# Altium footprint library LUMI_Handy_Soldering_LIB.PcbLib: 562 footprints (part 24 of 36)
Each footprint in its own frame and in the unit in brackets; x right, y up, seen from the top. Pads: shape width x height; smd on the part's side, far side on the other; paste and mask are expansions set on the pad; w line width, h text height; cw(c..) or ccw(c..) is an arc to the next point about the centre after c.
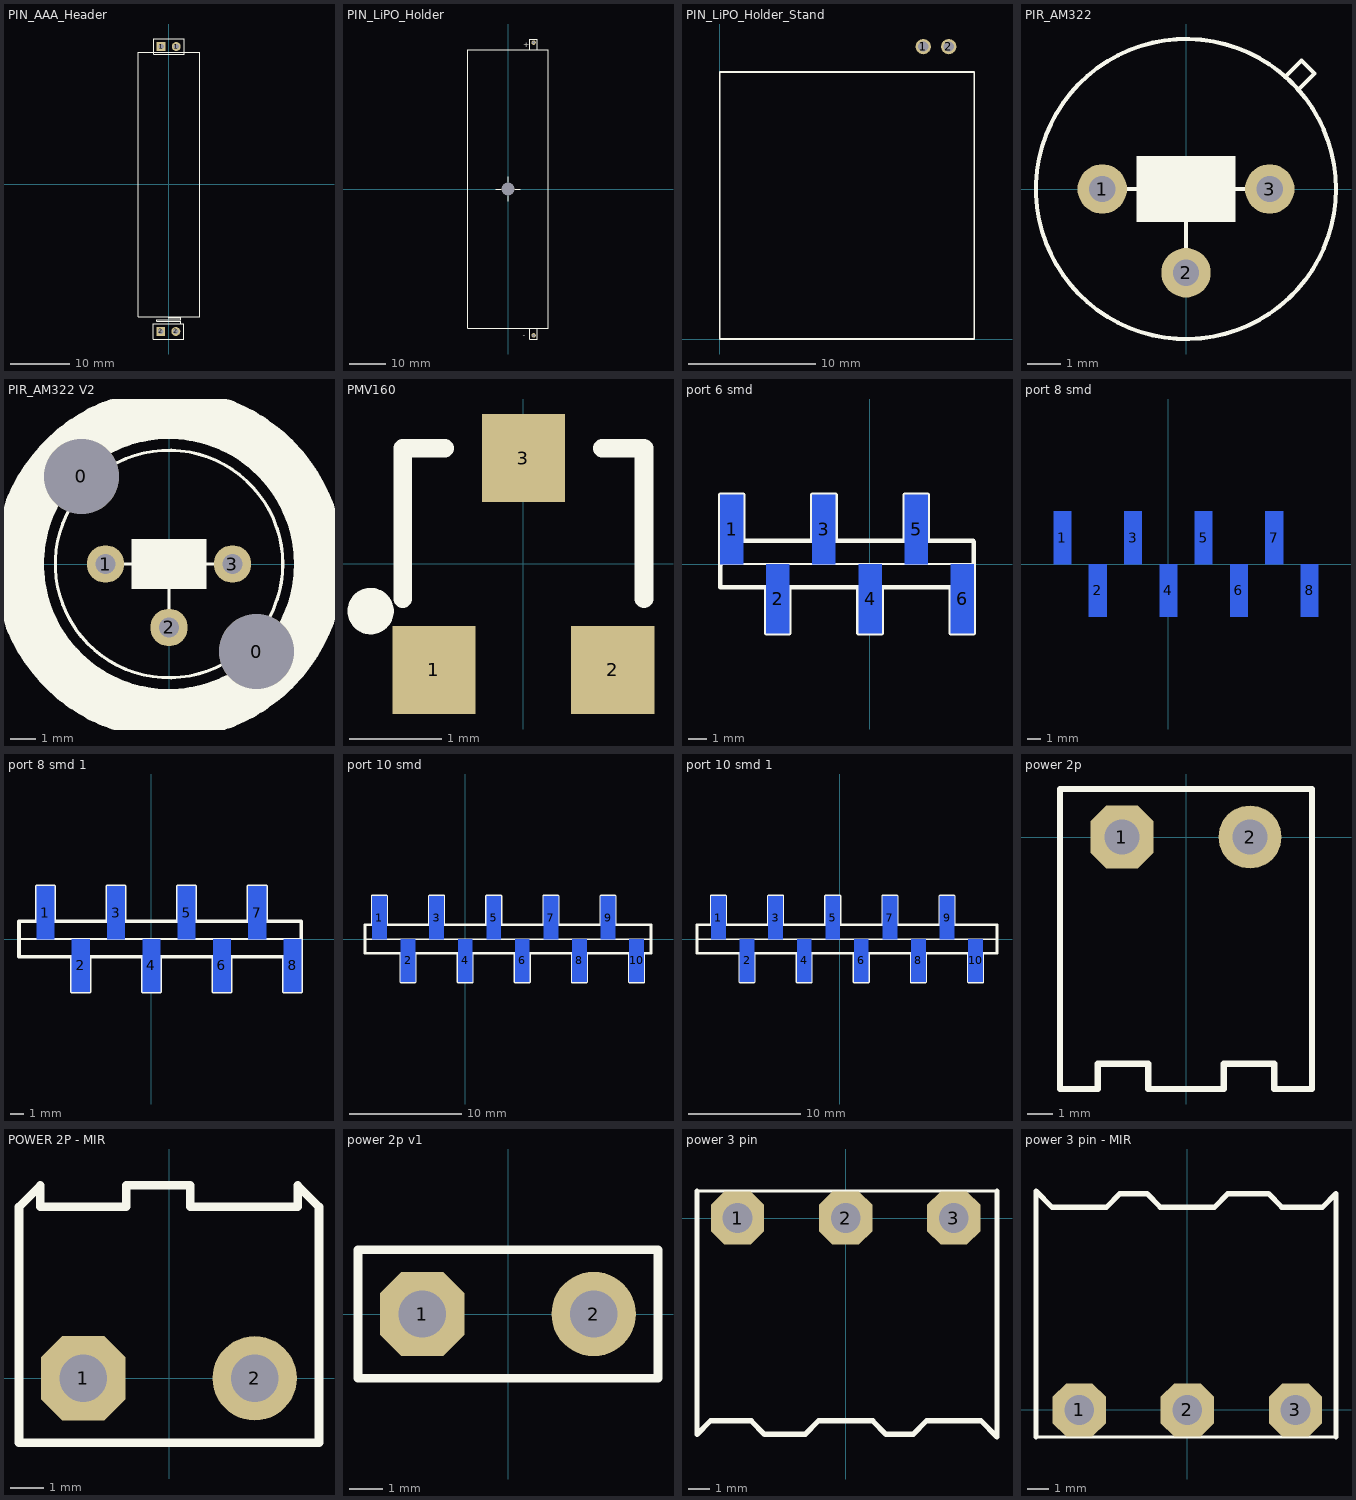
[diagram p23: the footprints below, top view; thin cyan lines are the x and y axes]

## PIN_AAA_Header [mm]
pads (4):
  rect 1.5x1.5 hole 0.9: 1(-1.275,23.15) 2(-1.34,-24.7)
  round 1.5 hole 0.9: 1(1.265,23.15) 2(1.2,-24.7)
Top Overlay:
  lines w0.127: -2,-23.43 2,-23.43 2,-23 -2,-23 -2,-22.7 2,-22.7 2,-22.4 -0.1,-22.4 ; 5.2,-22.2 -5.1,-22.2 -5.1,22.2 5.2,22.2 5.2,-22.2 ; 5.2,-22.2 5.2,-22.2
  lines w0.2: -2.61,-25.97 2.56,-25.97 2.56,-23.43 -2.61,-23.43 -2.61,-25.97 ; -2.545,21.88 -2.545,24.42 2.625,24.42 2.625,21.88 -2.545,21.88
3D body: height 9.13, standoff -1.13, extent -5.05,-22.175 5.2,22.175
3D body: height 8.55, standoff -2.43, extent -2.559,-25.945 2.521,-23.405
3D body: height 8.55, standoff -2.43, extent -2.494,21.905 2.586,24.445

## PIN_LiPO_Holder [mm]
pads (3):
  round 0 hole 3.5: 0(0,0)
  round 1.2 hole 0.8: 1(7,40) 2(7,-40)
Top Overlay:
  lines w0.127: -3.3,0 -1.8,0 ; 0,-3.3 0,-1.8 ; 0,1.8 0,3.3 ; 1.8,0 3.3,0 ; 6,-38 6,-41 8,-41 8,-38 ; 6,38 6,41 8,41 8,38 ; -11,-38 -11,38 11,38 11,-38 -11,-38
  text "-" at 4,-40.8 h1.52
  text "+" at 4.1,38.8 h1.52
3D body: height 21, standoff 1, extent -11,-38 11,38

## PIN_LiPO_Holder_Stand [mm]
pads (2):
  round 1.2 hole 0.8: 1(16,23) 2(18,23)
Top Overlay:
  lines w0.127: 0,0 0,21 20,21 20,0 0,0

## PIR_AM322 [mm]
pads (3):
  round 1.5 hole 0.8: 1(-2.54,0) 2(0,-2.54) 3(2.54,0)
Top Overlay:
  circle w0.127: c0,0 r4.55
  rectangle: -1.5,-1 1.5,1
  lines w0.127: -2.54,0 0,0 ; 0,-2.54 0,0 ; 2.54,0 0,0 ; 3,3.4 3.5,3.9 ; 3.4,3 3.4,3 ; 3.4,3 3.9,3.5 3.5,3.9 ; 3.5,3.9 3.5,3.9
3D body: height 4.7, standoff -2, extent -4.55,-4.55 4.52,4.55

## PIR_AM322 V2 [mm]
pads (5):
  round 3 hole 3: 0(-3.5,3.5) 0(3.5,-3.5)
  round 1.5 hole 0.8: 1(-2.54,0) 2(0,-2.54) 3(2.54,0)
Top Overlay:
  circle w2: c0,0 r6
  circle w0.127: c0,0 r4.55
  rectangle: -1.5,-1 1.5,1
  lines w0.127: -3.4,3 -3.9,3.5 ; -2.54,0 0,0 ; 0,-2.54 0,0 ; 2.54,0 0,0 ; -3.9,3.5 -3.9,3.5 ; -3.9,3.5 -3.5,3.9 -3,3.4 ; -3,3.4 -3,3.4
3D body: height 4.7, standoff -2, extent -4.55,-4.55 4.55,4.52

## PMV160 [mm] "P-MOSFET"
pads (3):
  rect 0.9x0.95 smd: 1(-0.965,-1.143) 2(0.965,-1.143) 3(0,1.143)
Top Overlay:
  circle w0.25: c-1.649,-0.508 r0.125
  lines w0.2: -1.3,-0.375 -1.3,1.25 -0.85,1.25 ; 0.85,1.25 1.3,1.25 1.3,-0.375
3D body: height 1, standoff 0, extent -1.46,-1.17 1.46,1.17

## port 6 smd [mm]
pads (6):
  rect 1.27x3.81 smd far side: 1(-7.605,1.925) 2(-5.065,-1.885) 3(-2.525,1.925) 4(0.015,-1.885) 5(2.555,1.925) 6(5.095,-1.885)
Top Overlay:
  lines w0.127: -8.128,0 5.73,0.02
  lines w0.254: -8.24,-1.25 -5.7,-1.25 -5.7,-3.79 -4.43,-3.79 -4.43,-1.25 -0.62,-1.25 -0.62,-3.79 0.65,-3.79 0.65,-1.25 4.46,-1.25 4.46,-3.79 5.73,-3.79 5.73,-1.25 5.73,1.255 5.695,1.29 3.19,1.29 3.19,3.83 1.92,3.83 1.92,1.29 -1.89,1.29 -1.89,3.83 -3.16,3.83 -3.16,1.29 -6.97,1.29 -6.97,3.83 -8.24,3.83 -8.24,1.29 -8.24,-1.25

## port 8 smd [mm]
pads (8):
  rect 1.27x3.81 smd far side: 1(-7.605,1.925) 2(-5.065,-1.885) 3(-2.525,1.925) 4(0.015,-1.885) 5(2.555,1.925) 6(5.095,-1.885) 7(7.635,1.925) 8(10.175,-1.885)

## port 8 smd 1 [mm]
pads (8):
  rect 1.27x3.81 smd far side: 1(-7.605,1.925) 2(-5.065,-1.885) 3(-2.525,1.925) 4(0.015,-1.885) 5(2.555,1.925) 6(5.095,-1.885) 7(7.635,1.925) 8(10.175,-1.885)
Top Overlay:
  lines w0.127: -9.51,0.02 10.79,0.02
  lines w0.254: 10.79,1.29 8.27,1.29 8.27,3.83 7,3.83 7,1.29 3.19,1.29 3.19,3.83 1.92,3.83 1.92,1.29 -1.89,1.29 -1.89,3.83 -3.16,3.83 -3.16,1.29 -6.97,1.29 -6.97,3.83 -8.24,3.83 -8.24,1.29 -9.51,1.29 -9.51,-1.25 -5.7,-1.25 -5.7,-3.79 -4.43,-3.79 -4.43,-1.25 -0.62,-1.25 -0.62,-3.79 0.65,-3.79 0.65,-1.25 4.46,-1.25 4.46,-3.79 5.73,-3.79 5.73,-1.25 9.54,-1.25 9.54,-3.79 10.81,-3.79 10.81,1.27

## port 10 smd [mm]
pads (10):
  rect 1.27x3.81 smd far side: 1(-7.62,1.905) 2(-5.08,-1.905) 3(-2.54,1.905) 4(0,-1.905) 5(2.54,1.905) 6(5.08,-1.905) 7(7.62,1.905) 8(10.16,-1.905) 9(12.7,1.905) 10(15.24,-1.905)
Top Overlay:
  lines w0.127: -8.89,0 16.51,0
  lines w0.254: -8.89,-1.27 -5.715,-1.27 -5.715,-3.81 -4.445,-3.81 -4.445,-1.27 -0.635,-1.27 -0.635,-3.81 0.635,-3.81 0.635,-1.27 4.445,-1.27 4.445,-3.81 5.715,-3.81 5.715,-1.27 9.525,-1.27 9.525,-3.81 10.795,-3.81 10.795,-1.27 13.97,-1.27 14.605,-1.27 14.605,-3.81 15.875,-3.81 15.875,-1.27 16.51,-1.27 16.51,1.27 13.97,1.27 13.335,1.27 13.335,3.81 12.065,3.81 12.065,1.27 8.255,1.27 8.255,3.81 6.985,3.81 6.985,1.27 3.175,1.27 3.175,3.81 1.905,3.81 1.905,1.27 -1.905,1.27 -1.905,3.81 -3.175,3.81 -3.175,1.27 -6.985,1.27 -6.985,3.81 -8.255,3.81 -8.255,1.27 -8.89,1.27 -8.89,-1.27
3D body: height -0.48, standoff -10.32, extent -8.89,-2.5 16.51,2.5

## port 10 smd 1 [mm]
pads (10):
  rect 1.27x3.81 smd far side: 1(-10.795,1.905) 2(-8.255,-1.905) 3(-5.715,1.905) 4(-3.175,-1.905) 5(-0.635,1.905) 6(1.905,-1.905) 7(4.445,1.905) 8(6.985,-1.905) 9(9.525,1.905) 10(12.065,-1.905)
Top Overlay:
  lines w0.127: -12.7,0 13.97,0
  lines w0.254: -12.7,-1.27 -8.89,-1.27 -8.89,-3.81 -7.62,-3.81 -7.62,-1.27 -3.81,-1.27 -3.81,-3.81 -2.54,-3.81 -2.54,-1.27 1.27,-1.27 1.27,-3.81 2.54,-3.81 2.54,-1.27 6.35,-1.27 6.35,-3.81 7.62,-3.81 7.62,-1.27 11.43,-1.27 11.43,-3.81 12.7,-3.81 12.7,-1.27 13.97,-1.27 13.97,1.27 10.16,1.27 10.16,3.81 8.89,3.81 8.89,1.27 5.08,1.27 5.08,3.81 3.81,3.81 3.81,1.27 0,1.27 0,3.81 -1.27,3.81 -1.27,1.27 -5.08,1.27 -5.08,3.81 -6.35,3.81 -6.35,1.27 -10.16,1.27 -10.16,3.81 -11.43,3.81 -11.43,1.27 -12.7,1.27 -12.7,-1.27

## power 2p [mm]
pads (2):
  oct 2.5x2.5 hole 1.397: 1(-2.54,0)
  round 2.5 hole 1.397: 2(2.54,0)
Top Overlay:
  lines w0.254: 5,-10 3.5,-10 3.5,-9 1.5,-9 1.5,-10 -1.5,-10 -1.5,-9 -3.5,-9 -3.5,-10 -5,-10 -5,-5.635 -5,1.905 5,1.905 5,-9.945
3D body: height 8.77, standoff -3.7, extent -5.04,-10.273 4.96,1.727

## POWER 2P - MIR [mm]
pads (2):
  oct 2.5x2.5 hole 1.397: 1(-2.54,0)
  round 2.5 hole 1.397: 2(2.54,0)
Top Overlay:
  lines w0.254: -4.445,-1.905 -4.445,5.08 -3.81,5.715 -3.81,5.08 -1.27,5.08 -1.27,5.715 0.635,5.715 0.635,5.08 3.81,5.08 3.81,5.715 4.445,5.08 4.445,-1.905 -4.445,-1.905

## power 2p v1 [mm]
pads (2):
  oct 2.5x2.5 hole 1.397: 1(-2.54,0)
  round 2.5 hole 1.397: 2(2.54,0)
Top Overlay:
  lines w0.254: -4.445,-1.905 -4.445,1.905 4.445,1.905 4.445,-1.905 -4.445,-1.905
3D body: height 8.47, standoff -4, extent -5.04,-10.273 4.96,1.727

## power 3 pin [mm] "hkgvh"
pads (3):
  oct 2.5x2.5 hole 1.4: 1(-5.08,0) 2(0,0) 3(5.08,0)
Top Overlay:
  lines w0.15: -6.985,1.27 7.112,1.27
  lines w0.254: -6.985,1.27 -6.985,-10.16 -6.35,-9.525 -4.445,-9.525 -3.81,-10.16 -1.905,-10.16 -1.27,-9.525 1.27,-9.525 1.905,-10.16 3.175,-10.16 3.81,-9.525 6.35,-9.525 7.112,-10.287 7.112,1.27
3D body: height 8.47, standoff -4, extent -7.544,-10.267 2.456,1.733
3D body: height 8.47, standoff -4, extent -2.525,-10.273 7.475,1.727

## power 3 pin - MIR [mm] "hkgvh"
pads (3):
  oct 2.5x2.5 hole 1.4: 1(-5.08,0) 2(0,0) 3(5.08,0)
Top Overlay:
  lines w0.15: -7.112,-1.27 6.985,-1.27
  lines w0.254: -7.112,-1.27 -7.112,10.287 -6.35,9.525 -3.81,9.525 -3.175,10.16 -1.905,10.16 -1.27,9.525 1.27,9.525 1.905,10.16 3.81,10.16 4.445,9.525 6.35,9.525 6.985,10.16 6.985,-1.27